# Altium schematic symbol library jlcpcb_2025_04_capacitors_extended_0603.schlib: 3668 symbols (part 17 of 20) (continued)
## GRM1882C1H331GA01D
designator C?  Capacitance: 330pF  (hidden comment: *)
Capacitor, Ceramic (MLCC), 330pF, ±2%, ±2%, SMD 0603; Manufacturer: Murata Electronics; Manufacturer Part Number: GRM1882C1H331GA01D; Package Size: 0603; JLCPCB Basic Part: No; JLCPCB Part Number: C913761; Supplier 1: LCSC; Category: Capacitors - MLCC; Supplier Part Number 1: C913761; Tolerance: ±2%; RoHS: Yes; ComponentLink1Description: Datasheet; ComponentLink1URL: https://wmsc.lcsc.com/wmsc/upload/file/pdf/v2/lcsc/2201131300_Murata-Electronics-GRM1882C1H331GA01D_C913761.pdf; ComponentLink2Description: JLCPCB Part URL; ComponentLink2URL: https://jlcpcb.com/partdetail/C913761; ComponentLink3Description: LCSC Part URL; ComponentLink3URL: https://lcsc.com/product-detail/Multilayer-Ceramic-Capacitors-MLCC---SMD-SMT_Murata-Electronics-Murata-Electronics-GRM1882C1H331GA01D_C913761.html
footprint CAP-0603 (0603 (1608M) Capacitor)
pins: 1, 2

## GRM1882C1H470JA01D
designator C?  Capacitance: 47pF  (hidden comment: *)
Capacitor, Ceramic (MLCC), 47pF, ±5%, ±5%, SMD 0603; Manufacturer: Murata Electronics; Manufacturer Part Number: GRM1882C1H470JA01D; Package Size: 0603; JLCPCB Basic Part: No; JLCPCB Part Number: C783271; Supplier 1: LCSC; Category: Capacitors - MLCC; Supplier Part Number 1: C783271; Tolerance: ±5%; RoHS: Yes; ComponentLink1Description: Datasheet; ComponentLink1URL: https://wmsc.lcsc.com/wmsc/upload/file/pdf/v2/lcsc/2304140030_Murata-Electronics-GRM1882C1H470JA01D_C783271.pdf; ComponentLink2Description: JLCPCB Part URL; ComponentLink2URL: https://jlcpcb.com/partdetail/C783271; ComponentLink3Description: LCSC Part URL; ComponentLink3URL: https://lcsc.com/product-detail/Multilayer-Ceramic-Capacitors-MLCC---SMD-SMT_Murata-Electronics-Murata-Electronics-GRM1882C1H470JA01D_C783271.html
footprint CAP-0603 (0603 (1608M) Capacitor)
pins: 1, 2

## GRM1882C1H680JA01D
designator C?  Capacitance: 68pF  (hidden comment: *)
Capacitor, Ceramic (MLCC), 68pF, ±5%, 50V, CH, ±5%, SMD 0603; Manufacturer: Murata Electronics; Manufacturer Part Number: GRM1882C1H680JA01D; Package Size: 0603; JLCPCB Basic Part: No; JLCPCB Part Number: C464424; Supplier 1: LCSC; Category: Capacitors - MLCC; Supplier Part Number 1: C464424; Tolerance: ±5%; Voltage Rating: 50V; Temperature Coefficient: CH; RoHS: Yes; ComponentLink1Description: Datasheet; ComponentLink1URL: https://wmsc.lcsc.com/wmsc/upload/file/pdf/v2/lcsc/2304140030_Murata-Electronics-GRM1882C1H680JA01D_C464424.pdf; ComponentLink2Description: JLCPCB Part URL; ComponentLink2URL: https://jlcpcb.com/partdetail/C464424; ComponentLink3Description: LCSC Part URL; ComponentLink3URL: https://lcsc.com/product-detail/Multilayer-Ceramic-Capacitors-MLCC---SMD-SMT_Murata-Electronics-Murata-Electronics-GRM1882C1H680JA01D_C464424.html
footprint CAP-0603 (0603 (1608M) Capacitor)
pins: 1, 2

## GRM1882C1H821JA01D
designator C?  Capacitance: 820pF  (hidden comment: *)
Capacitor, Ceramic (MLCC), 820pF, ±5%, 50V, CH, ±5%, SMD 0603; Manufacturer: Murata Electronics; Manufacturer Part Number: GRM1882C1H821JA01D; Package Size: 0603; JLCPCB Basic Part: No; JLCPCB Part Number: C363961; Supplier 1: LCSC; Category: Capacitors - MLCC; Supplier Part Number 1: C363961; Tolerance: ±5%; Voltage Rating: 50V; Temperature Coefficient: CH; RoHS: Yes; ComponentLink1Description: Datasheet; ComponentLink1URL: https://wmsc.lcsc.com/wmsc/upload/file/pdf/v2/lcsc/1912111437_Murata-Electronics-GRM1882C1H821JA01D_C363961.pdf; ComponentLink2Description: JLCPCB Part URL; ComponentLink2URL: https://jlcpcb.com/partdetail/C363961; ComponentLink3Description: LCSC Part URL; ComponentLink3URL: https://lcsc.com/product-detail/Multilayer-Ceramic-Capacitors-MLCC---SMD-SMT_Murata-Electronics-Murata-Electronics-GRM1882C1H821JA01D_C363961.html
footprint CAP-0603 (0603 (1608M) Capacitor)
pins: 1, 2

## GRM1882C2A101JA01D
designator C?  Capacitance: 100pF  (hidden comment: *)
Capacitor, Ceramic (MLCC), 100pF, ±5%, ±5%, SMD 0603; Manufacturer: Murata Electronics; Manufacturer Part Number: GRM1882C2A101JA01D; Package Size: 0603; JLCPCB Basic Part: No; JLCPCB Part Number: C913650; Supplier 1: LCSC; Category: Capacitors - MLCC; Supplier Part Number 1: C913650; Tolerance: ±5%; RoHS: Yes; ComponentLink1Description: Datasheet; ComponentLink1URL: https://wmsc.lcsc.com/wmsc/upload/file/pdf/v2/lcsc/2201131300_Murata-Electronics-GRM1882C2A101JA01D_C913650.pdf; ComponentLink2Description: JLCPCB Part URL; ComponentLink2URL: https://jlcpcb.com/partdetail/C913650; ComponentLink3Description: LCSC Part URL; ComponentLink3URL: https://lcsc.com/product-detail/Multilayer-Ceramic-Capacitors-MLCC---SMD-SMT_Murata-Electronics-Murata-Electronics-GRM1882C2A101JA01D_C913650.html
footprint CAP-0603 (0603 (1608M) Capacitor)
pins: 1, 2

## GRM1882C2A471JA01D
designator C?  Capacitance: 470pF  (hidden comment: *)
Capacitor, Ceramic (MLCC), 470pF, ±5%, ±5%, SMD 0603; Manufacturer: Murata Electronics; Manufacturer Part Number: GRM1882C2A471JA01D; Package Size: 0603; JLCPCB Basic Part: No; JLCPCB Part Number: C913649; Supplier 1: LCSC; Category: Capacitors - MLCC; Supplier Part Number 1: C913649; Tolerance: ±5%; RoHS: Yes; ComponentLink1Description: Datasheet; ComponentLink1URL: https://wmsc.lcsc.com/wmsc/upload/file/pdf/v2/lcsc/2201131300_Murata-Electronics-GRM1882C2A471JA01D_C913649.pdf; ComponentLink2Description: JLCPCB Part URL; ComponentLink2URL: https://jlcpcb.com/partdetail/C913649; ComponentLink3Description: LCSC Part URL; ComponentLink3URL: https://lcsc.com/product-detail/Multilayer-Ceramic-Capacitors-MLCC---SMD-SMT_Murata-Electronics-Murata-Electronics-GRM1882C2A471JA01D_C913649.html
footprint CAP-0603 (0603 (1608M) Capacitor)
pins: 1, 2

## GRM1885C1E103GA01D
designator C?  Capacitance: 10nF  (hidden comment: *)
Capacitor, Ceramic (MLCC), 10nF, ±2%, 25V, C0G, ±2%, SMD 0603; Manufacturer: Murata Electronics; Manufacturer Part Number: GRM1885C1E103GA01D; Package Size: 0603; JLCPCB Basic Part: No; JLCPCB Part Number: C527623; Supplier 1: LCSC; Category: Capacitors - MLCC; Supplier Part Number 1: C527623; Tolerance: ±2%; Voltage Rating: 25V; Temperature Coefficient: C0G; RoHS: Yes; ComponentLink1Description: Datasheet; ComponentLink1URL: https://wmsc.lcsc.com/wmsc/upload/file/pdf/v2/lcsc/2005150732_Murata-Electronics-GRM1885C1E103GA01D_C527623.pdf; ComponentLink2Description: JLCPCB Part URL; ComponentLink2URL: https://jlcpcb.com/partdetail/C527623; ComponentLink3Description: LCSC Part URL; ComponentLink3URL: https://lcsc.com/product-detail/Multilayer-Ceramic-Capacitors-MLCC---SMD-SMT_Murata-Electronics-Murata-Electronics-GRM1885C1E103GA01D_C527623.html
footprint CAP-0603 (0603 (1608M) Capacitor)
pins: 1, 2

## GRM1885C1H1R0CA01D
designator C?  Capacitance: 1pF  (hidden comment: *)
Capacitor, Ceramic (MLCC), 1pF, 50V, C0G, SMD 0603; Manufacturer: Murata Electronics; Manufacturer Part Number: GRM1885C1H1R0CA01D; Package Size: 0603; JLCPCB Basic Part: No; JLCPCB Part Number: C162206; Supplier 1: LCSC; Category: Capacitors - MLCC; Supplier Part Number 1: C162206; Voltage Rating: 50V; Temperature Coefficient: C0G; RoHS: Yes; ComponentLink1Description: Datasheet; ComponentLink1URL: https://wmsc.lcsc.com/wmsc/upload/file/pdf/v2/lcsc/2304140030_Murata-Electronics-GRM1885C1H1R0CA01D_C162206.pdf; ComponentLink2Description: JLCPCB Part URL; ComponentLink2URL: https://jlcpcb.com/partdetail/C162206; ComponentLink3Description: LCSC Part URL; ComponentLink3URL: https://lcsc.com/product-detail/Multilayer-Ceramic-Capacitors-MLCC---SMD-SMT_Murata-Electronics-Murata-Electronics-GRM1885C1H1R0CA01D_C162206.html
footprint CAP-0603 (0603 (1608M) Capacitor)
pins: 1, 2

## GRM1885C1H1R0WA01D
designator C?  Capacitance: 1pF  (hidden comment: *)
Capacitor, Ceramic (MLCC), 1pF, null, null, SMD 0603; Manufacturer: Murata Electronics; Manufacturer Part Number: GRM1885C1H1R0WA01D; Package Size: 0603; JLCPCB Basic Part: No; JLCPCB Part Number: C524619; Supplier 1: LCSC; Category: Capacitors - MLCC; Supplier Part Number 1: C524619; Voltage Rating: null; Temperature Coefficient: null; RoHS: Yes; ComponentLink1Description: Datasheet; ComponentLink1URL: https://wmsc.lcsc.com/wmsc/upload/file/pdf/v2/lcsc/2009021102_Murata-Electronics-GRM1885C1H1R0WA01D_C524619.pdf; ComponentLink2Description: JLCPCB Part URL; ComponentLink2URL: https://jlcpcb.com/partdetail/C524619; ComponentLink3Description: LCSC Part URL; ComponentLink3URL: https://lcsc.com/product-detail/Multilayer-Ceramic-Capacitors-MLCC---SMD-SMT_Murata-Electronics-Murata-Electronics-GRM1885C1H1R0WA01D_C524619.html
footprint CAP-0603 (0603 (1608M) Capacitor)
pins: 1, 2

## GRM1885C1H1R2BA01D
designator C?  Capacitance: 1.2pF  (hidden comment: *)
Capacitor, Ceramic (MLCC), 1.2pF, 50V, C0G, SMD 0603; Manufacturer: Murata Electronics; Manufacturer Part Number: GRM1885C1H1R2BA01D; Package Size: 0603; JLCPCB Basic Part: No; JLCPCB Part Number: C162208; Supplier 1: LCSC; Category: Capacitors - MLCC; Supplier Part Number 1: C162208; Voltage Rating: 50V; Temperature Coefficient: C0G; RoHS: Yes; ComponentLink1Description: Datasheet; ComponentLink1URL: https://wmsc.lcsc.com/wmsc/upload/file/pdf/v2/lcsc/2304140030_Murata-Electronics-GRM1885C1H1R2BA01D_C162208.pdf; ComponentLink2Description: JLCPCB Part URL; ComponentLink2URL: https://jlcpcb.com/partdetail/C162208; ComponentLink3Description: LCSC Part URL; ComponentLink3URL: https://lcsc.com/product-detail/Multilayer-Ceramic-Capacitors-MLCC---SMD-SMT_Murata-Electronics-Murata-Electronics-GRM1885C1H1R2BA01D_C162208.html
footprint CAP-0603 (0603 (1608M) Capacitor)
pins: 1, 2

## GRM1885C1H1R2CA01D
designator C?  Capacitance: 1.2pF  (hidden comment: *)
Capacitor, Ceramic (MLCC), 1.2pF, 50V, C0G, SMD 0603; Manufacturer: Murata Electronics; Manufacturer Part Number: GRM1885C1H1R2CA01D; Package Size: 0603; JLCPCB Basic Part: No; JLCPCB Part Number: C437533; Supplier 1: LCSC; Category: Capacitors - MLCC; Supplier Part Number 1: C437533; Voltage Rating: 50V; Temperature Coefficient: C0G; RoHS: Yes; ComponentLink1Description: Datasheet; ComponentLink1URL: https://wmsc.lcsc.com/wmsc/upload/file/pdf/v2/lcsc/2304140030_Murata-Electronics-GRM1885C1H1R2CA01D_C437533.pdf; ComponentLink2Description: JLCPCB Part URL; ComponentLink2URL: https://jlcpcb.com/partdetail/C437533; ComponentLink3Description: LCSC Part URL; ComponentLink3URL: https://lcsc.com/product-detail/Multilayer-Ceramic-Capacitors-MLCC---SMD-SMT_Murata-Electronics-Murata-Electronics-GRM1885C1H1R2CA01D_C437533.html
footprint CAP-0603 (0603 (1608M) Capacitor)
pins: 1, 2

## GRM1885C1H1R2WA01D
designator C?  Capacitance: 1.2pF  (hidden comment: *)
Capacitor, Ceramic (MLCC), 1.2pF, SMD 0603; Manufacturer: Murata Electronics; Manufacturer Part Number: GRM1885C1H1R2WA01D; Package Size: 0603; JLCPCB Basic Part: No; JLCPCB Part Number: C913539; Supplier 1: LCSC; Category: Capacitors - MLCC; Supplier Part Number 1: C913539; RoHS: Yes; ComponentLink1Description: Datasheet; ComponentLink1URL: https://wmsc.lcsc.com/wmsc/upload/file/pdf/v2/lcsc/2201131300_Murata-Electronics-GRM1885C1H1R2WA01D_C913539.pdf; ComponentLink2Description: JLCPCB Part URL; ComponentLink2URL: https://jlcpcb.com/partdetail/C913539; ComponentLink3Description: LCSC Part URL; ComponentLink3URL: https://lcsc.com/product-detail/Multilayer-Ceramic-Capacitors-MLCC---SMD-SMT_Murata-Electronics-Murata-Electronics-GRM1885C1H1R2WA01D_C913539.html
footprint CAP-0603 (0603 (1608M) Capacitor)
pins: 1, 2

## GRM1885C1H1R3WA01D
designator C?  Capacitance: 1.3pF  (hidden comment: *)
Capacitor, Ceramic (MLCC), 1.3pF, SMD 0603; Manufacturer: Murata Electronics; Manufacturer Part Number: GRM1885C1H1R3WA01D; Package Size: 0603; JLCPCB Basic Part: No; JLCPCB Part Number: C907985; Supplier 1: LCSC; Category: Capacitors - MLCC; Supplier Part Number 1: C907985; RoHS: Yes; ComponentLink1Description: Datasheet; ComponentLink1URL: https://wmsc.lcsc.com/wmsc/upload/file/pdf/v2/lcsc/2011291635_Murata-Electronics-GRM1885C1H1R3WA01D_C907985.pdf; ComponentLink2Description: JLCPCB Part URL; ComponentLink2URL: https://jlcpcb.com/partdetail/C907985; ComponentLink3Description: LCSC Part URL; ComponentLink3URL: https://lcsc.com/product-detail/Multilayer-Ceramic-Capacitors-MLCC---SMD-SMT_Murata-Electronics-Murata-Electronics-GRM1885C1H1R3WA01D_C907985.html
footprint CAP-0603 (0603 (1608M) Capacitor)
pins: 1, 2

## GRM1885C1H2R0BA01D
designator C?  Capacitance: 2pF  (hidden comment: *)
Capacitor, Ceramic (MLCC), 2pF, 50V, C0G, SMD 0603; Manufacturer: Murata Electronics; Manufacturer Part Number: GRM1885C1H2R0BA01D; Package Size: 0603; JLCPCB Basic Part: No; JLCPCB Part Number: C81437; Supplier 1: LCSC; Category: Capacitors - MLCC; Supplier Part Number 1: C81437; Voltage Rating: 50V; Temperature Coefficient: C0G; RoHS: Yes; ComponentLink1Description: Datasheet; ComponentLink1URL: https://wmsc.lcsc.com/wmsc/upload/file/pdf/v2/lcsc/2001171841_Murata-Electronics-GRM1885C1H2R0BA01D_C81437.pdf; ComponentLink2Description: JLCPCB Part URL; ComponentLink2URL: https://jlcpcb.com/partdetail/C81437; ComponentLink3Description: LCSC Part URL; ComponentLink3URL: https://lcsc.com/product-detail/Multilayer-Ceramic-Capacitors-MLCC---SMD-SMT_Murata-Electronics-Murata-Electronics-GRM1885C1H2R0BA01D_C81437.html
footprint CAP-0603 (0603 (1608M) Capacitor)
pins: 1, 2

## GRM1885C1H2R4CA01D
designator C?  Capacitance: 2.4pF  (hidden comment: *)
Capacitor, Ceramic (MLCC), 2.4pF, 50V, C0G, SMD 0603; Manufacturer: Murata Electronics; Manufacturer Part Number: GRM1885C1H2R4CA01D; Package Size: 0603; JLCPCB Basic Part: No; JLCPCB Part Number: C710896; Supplier 1: LCSC; Category: Capacitors - MLCC; Supplier Part Number 1: C710896; Voltage Rating: 50V; Temperature Coefficient: C0G; RoHS: Yes; ComponentLink1Description: Datasheet; ComponentLink1URL: https://wmsc.lcsc.com/wmsc/upload/file/pdf/v2/lcsc/2201242200_Murata-Electronics-GRM1885C1H2R4CA01D_C710896.pdf; ComponentLink2Description: JLCPCB Part URL; ComponentLink2URL: https://jlcpcb.com/partdetail/C710896; ComponentLink3Description: LCSC Part URL; ComponentLink3URL: https://lcsc.com/product-detail/Multilayer-Ceramic-Capacitors-MLCC---SMD-SMT_Murata-Electronics-Murata-Electronics-GRM1885C1H2R4CA01D_C710896.html
footprint CAP-0603 (0603 (1608M) Capacitor)
pins: 1, 2

## GRM1885C1H2R7BA01D
designator C?  Capacitance: 2.7pF  (hidden comment: *)
Capacitor, Ceramic (MLCC), 2.7pF, 50V, C0G, SMD 0603; Manufacturer: Murata Electronics; Manufacturer Part Number: GRM1885C1H2R7BA01D; Package Size: 0603; JLCPCB Basic Part: No; JLCPCB Part Number: C162221; Supplier 1: LCSC; Category: Capacitors - MLCC; Supplier Part Number 1: C162221; Voltage Rating: 50V; Temperature Coefficient: C0G; RoHS: Yes; ComponentLink1Description: Datasheet; ComponentLink1URL: https://wmsc.lcsc.com/wmsc/upload/file/pdf/v2/lcsc/2304140030_Murata-Electronics-GRM1885C1H2R7BA01D_C162221.pdf; ComponentLink2Description: JLCPCB Part URL; ComponentLink2URL: https://jlcpcb.com/partdetail/C162221; ComponentLink3Description: LCSC Part URL; ComponentLink3URL: https://lcsc.com/product-detail/Multilayer-Ceramic-Capacitors-MLCC---SMD-SMT_Murata-Electronics-Murata-Electronics-GRM1885C1H2R7BA01D_C162221.html
footprint CAP-0603 (0603 (1608M) Capacitor)
pins: 1, 2

## GRM1885C1H2R7CA01D
designator C?  Capacitance: 2.7pF  (hidden comment: *)
Capacitor, Ceramic (MLCC), 2.7pF, null, null, SMD 0603; Manufacturer: Murata Electronics; Manufacturer Part Number: GRM1885C1H2R7CA01D; Package Size: 0603; JLCPCB Basic Part: No; JLCPCB Part Number: C701311; Supplier 1: LCSC; Category: Capacitors - MLCC; Supplier Part Number 1: C701311; Voltage Rating: null; Temperature Coefficient: null; RoHS: Yes; ComponentLink1Description: Datasheet; ComponentLink1URL: https://wmsc.lcsc.com/wmsc/upload/file/pdf/v2/lcsc/2304140030_Murata-Electronics-GRM1885C1H2R7CA01D_C701311.pdf; ComponentLink2Description: JLCPCB Part URL; ComponentLink2URL: https://jlcpcb.com/partdetail/C701311; ComponentLink3Description: LCSC Part URL; ComponentLink3URL: https://lcsc.com/product-detail/Multilayer-Ceramic-Capacitors-MLCC---SMD-SMT_Murata-Electronics-Murata-Electronics-GRM1885C1H2R7CA01D_C701311.html
footprint CAP-0603 (0603 (1608M) Capacitor)
pins: 1, 2

## GRM1885C1H3R0CA01D
designator C?  Capacitance: 3pF  (hidden comment: *)
Capacitor, Ceramic (MLCC), 3pF, 50V, C0G, SMD 0603; Manufacturer: Murata Electronics; Manufacturer Part Number: GRM1885C1H3R0CA01D; Package Size: 0603; JLCPCB Basic Part: No; JLCPCB Part Number: C162223; Supplier 1: LCSC; Category: Capacitors - MLCC; Supplier Part Number 1: C162223; Voltage Rating: 50V; Temperature Coefficient: C0G; RoHS: Yes; ComponentLink1Description: Datasheet; ComponentLink1URL: https://wmsc.lcsc.com/wmsc/upload/file/pdf/v2/lcsc/2304140030_Murata-Electronics-GRM1885C1H3R0CA01D_C162223.pdf; ComponentLink2Description: JLCPCB Part URL; ComponentLink2URL: https://jlcpcb.com/partdetail/C162223; ComponentLink3Description: LCSC Part URL; ComponentLink3URL: https://lcsc.com/product-detail/Multilayer-Ceramic-Capacitors-MLCC---SMD-SMT_Murata-Electronics-Murata-Electronics-GRM1885C1H3R0CA01D_C162223.html
footprint CAP-0603 (0603 (1608M) Capacitor)
pins: 1, 2

## GRM1885C1H3R3BA01D
designator C?  Capacitance: 3.3pF  (hidden comment: *)
Capacitor, Ceramic (MLCC), 3.3pF, 50V, C0G, SMD 0603; Manufacturer: Murata Electronics; Manufacturer Part Number: GRM1885C1H3R3BA01D; Package Size: 0603; JLCPCB Basic Part: No; JLCPCB Part Number: C162224; Supplier 1: LCSC; Category: Capacitors - MLCC; Supplier Part Number 1: C162224; Voltage Rating: 50V; Temperature Coefficient: C0G; RoHS: Yes; ComponentLink1Description: Datasheet; ComponentLink1URL: https://wmsc.lcsc.com/wmsc/upload/file/pdf/v2/lcsc/2401250905_Murata-Electronics-GRM1885C1H3R3BA01D_C162224.pdf; ComponentLink2Description: JLCPCB Part URL; ComponentLink2URL: https://jlcpcb.com/partdetail/C162224; ComponentLink3Description: LCSC Part URL; ComponentLink3URL: https://lcsc.com/product-detail/Multilayer-Ceramic-Capacitors-MLCC---SMD-SMT_Murata-Electronics-Murata-Electronics-GRM1885C1H3R3BA01D_C162224.html
footprint CAP-0603 (0603 (1608M) Capacitor)
pins: 1, 2

## GRM1885C1H3R3CA01D
designator C?  Capacitance: 3.3pF  (hidden comment: *)
Capacitor, Ceramic (MLCC), 3.3pF, 50V, C0G, SMD 0603; Manufacturer: Murata Electronics; Manufacturer Part Number: GRM1885C1H3R3CA01D; Package Size: 0603; JLCPCB Basic Part: No; JLCPCB Part Number: C162225; Supplier 1: LCSC; Category: Capacitors - MLCC; Supplier Part Number 1: C162225; Voltage Rating: 50V; Temperature Coefficient: C0G; RoHS: Yes; ComponentLink1Description: Datasheet; ComponentLink1URL: https://wmsc.lcsc.com/wmsc/upload/file/pdf/v2/lcsc/1810311132_Murata-Electronics-GRM1885C1H3R3CA01D_C162225.pdf; ComponentLink2Description: JLCPCB Part URL; ComponentLink2URL: https://jlcpcb.com/partdetail/C162225; ComponentLink3Description: LCSC Part URL; ComponentLink3URL: https://lcsc.com/product-detail/Multilayer-Ceramic-Capacitors-MLCC---SMD-SMT_Murata-Electronics-Murata-Electronics-GRM1885C1H3R3CA01D_C162225.html
footprint CAP-0603 (0603 (1608M) Capacitor)
pins: 1, 2

## GRM1885C1H3R5BA01D
designator C?  Capacitance: 3.5pF  (hidden comment: *)
Capacitor, Ceramic (MLCC), 3.5pF, 50V, C0G, SMD 0603; Manufacturer: Murata Electronics; Manufacturer Part Number: GRM1885C1H3R5BA01D; Package Size: 0603; JLCPCB Basic Part: No; JLCPCB Part Number: C464415; Supplier 1: LCSC; Category: Capacitors - MLCC; Supplier Part Number 1: C464415; Voltage Rating: 50V; Temperature Coefficient: C0G; RoHS: Yes; ComponentLink1Description: Datasheet; ComponentLink1URL: https://wmsc.lcsc.com/wmsc/upload/file/pdf/v2/lcsc/2304140030_Murata-Electronics-GRM1885C1H3R5BA01D_C464415.pdf; ComponentLink2Description: JLCPCB Part URL; ComponentLink2URL: https://jlcpcb.com/partdetail/C464415; ComponentLink3Description: LCSC Part URL; ComponentLink3URL: https://lcsc.com/product-detail/Multilayer-Ceramic-Capacitors-MLCC---SMD-SMT_Murata-Electronics-Murata-Electronics-GRM1885C1H3R5BA01D_C464415.html
footprint CAP-0603 (0603 (1608M) Capacitor)
pins: 1, 2

## GRM1885C1H3R9BA01D
designator C?  Capacitance: 3.9pF  (hidden comment: *)
Capacitor, Ceramic (MLCC), 3.9pF, 50V, null, SMD 0603; Manufacturer: Murata Electronics; Manufacturer Part Number: GRM1885C1H3R9BA01D; Package Size: 0603; JLCPCB Basic Part: No; JLCPCB Part Number: C162229; Supplier 1: LCSC; Category: Capacitors - MLCC; Supplier Part Number 1: C162229; Voltage Rating: 50V; Temperature Coefficient: null; RoHS: Yes; ComponentLink1Description: Datasheet; ComponentLink1URL: https://wmsc.lcsc.com/wmsc/upload/file/pdf/v2/lcsc/2010101433_Murata-Electronics-GRM1885C1H3R9BA01D_C162229.pdf; ComponentLink2Description: JLCPCB Part URL; ComponentLink2URL: https://jlcpcb.com/partdetail/C162229; ComponentLink3Description: LCSC Part URL; ComponentLink3URL: https://lcsc.com/product-detail/Multilayer-Ceramic-Capacitors-MLCC---SMD-SMT_Murata-Electronics-Murata-Electronics-GRM1885C1H3R9BA01D_C162229.html
footprint CAP-0603 (0603 (1608M) Capacitor)
pins: 1, 2

## GRM1885C1H3R9CA01D
designator C?  Capacitance: 3.9pF  (hidden comment: *)
Capacitor, Ceramic (MLCC), 3.9pF, 50V, C0G, SMD 0603; Manufacturer: Murata Electronics; Manufacturer Part Number: GRM1885C1H3R9CA01D; Package Size: 0603; JLCPCB Basic Part: No; JLCPCB Part Number: C162230; Supplier 1: LCSC; Category: Capacitors - MLCC; Supplier Part Number 1: C162230; Voltage Rating: 50V; Temperature Coefficient: C0G; RoHS: Yes; ComponentLink1Description: Datasheet; ComponentLink1URL: https://wmsc.lcsc.com/wmsc/upload/file/pdf/v2/lcsc/2308111539_Murata-Electronics-GRM1885C1H3R9CA01D_C162230.pdf; ComponentLink2Description: JLCPCB Part URL; ComponentLink2URL: https://jlcpcb.com/partdetail/C162230; ComponentLink3Description: LCSC Part URL; ComponentLink3URL: https://lcsc.com/product-detail/Multilayer-Ceramic-Capacitors-MLCC---SMD-SMT_Murata-Electronics-Murata-Electronics-GRM1885C1H3R9CA01D_C162230.html
footprint CAP-0603 (0603 (1608M) Capacitor)
pins: 1, 2

## GRM1885C1H4R0BA01D
designator C?  Capacitance: 4pF  (hidden comment: *)
Capacitor, Ceramic (MLCC), 4pF, 50V, null, SMD 0603; Manufacturer: Murata Electronics; Manufacturer Part Number: GRM1885C1H4R0BA01D; Package Size: 0603; JLCPCB Basic Part: No; JLCPCB Part Number: C162232; Supplier 1: LCSC; Category: Capacitors - MLCC; Supplier Part Number 1: C162232; Voltage Rating: 50V; Temperature Coefficient: null; RoHS: Yes; ComponentLink1Description: Datasheet; ComponentLink1URL: https://wmsc.lcsc.com/wmsc/upload/file/pdf/v2/lcsc/2012211404_Murata-Electronics-GRM1885C1H4R0BA01D_C162232.pdf; ComponentLink2Description: JLCPCB Part URL; ComponentLink2URL: https://jlcpcb.com/partdetail/C162232; ComponentLink3Description: LCSC Part URL; ComponentLink3URL: https://lcsc.com/product-detail/Multilayer-Ceramic-Capacitors-MLCC---SMD-SMT_Murata-Electronics-Murata-Electronics-GRM1885C1H4R0BA01D_C162232.html
footprint CAP-0603 (0603 (1608M) Capacitor)
pins: 1, 2

## GRM1885C1H4R0CA01D
designator C?  Capacitance: 4pF  (hidden comment: *)
Capacitor, Ceramic (MLCC), 4pF, 50V, C0G, SMD 0603; Manufacturer: Murata Electronics; Manufacturer Part Number: GRM1885C1H4R0CA01D; Package Size: 0603; JLCPCB Basic Part: No; JLCPCB Part Number: C437534; Supplier 1: LCSC; Category: Capacitors - MLCC; Supplier Part Number 1: C437534; Voltage Rating: 50V; Temperature Coefficient: C0G; RoHS: Yes; ComponentLink1Description: Datasheet; ComponentLink1URL: https://wmsc.lcsc.com/wmsc/upload/file/pdf/v2/lcsc/2304140030_Murata-Electronics-GRM1885C1H4R0CA01D_C437534.pdf; ComponentLink2Description: JLCPCB Part URL; ComponentLink2URL: https://jlcpcb.com/partdetail/C437534; ComponentLink3Description: LCSC Part URL; ComponentLink3URL: https://lcsc.com/product-detail/Multilayer-Ceramic-Capacitors-MLCC---SMD-SMT_Murata-Electronics-Murata-Electronics-GRM1885C1H4R0CA01D_C437534.html
footprint CAP-0603 (0603 (1608M) Capacitor)
pins: 1, 2

## GRM1885C1H5R6BA01D
designator C?  Capacitance: 5.6pF  (hidden comment: *)
Capacitor, Ceramic (MLCC), 5.6pF, 50V, null, SMD 0603; Manufacturer: Murata Electronics; Manufacturer Part Number: GRM1885C1H5R6BA01D; Package Size: 0603; JLCPCB Basic Part: No; JLCPCB Part Number: C162238; Supplier 1: LCSC; Category: Capacitors - MLCC; Supplier Part Number 1: C162238; Voltage Rating: 50V; Temperature Coefficient: null; RoHS: Yes; ComponentLink1Description: Datasheet; ComponentLink1URL: https://wmsc.lcsc.com/wmsc/upload/file/pdf/v2/lcsc/2010101433_Murata-Electronics-GRM1885C1H5R6BA01D_C162238.pdf; ComponentLink2Description: JLCPCB Part URL; ComponentLink2URL: https://jlcpcb.com/partdetail/C162238; ComponentLink3Description: LCSC Part URL; ComponentLink3URL: https://lcsc.com/product-detail/Multilayer-Ceramic-Capacitors-MLCC---SMD-SMT_Murata-Electronics-Murata-Electronics-GRM1885C1H5R6BA01D_C162238.html
footprint CAP-0603 (0603 (1608M) Capacitor)
pins: 1, 2

## GRM1885C1H6R0DA01D
designator C?  Capacitance: 6pF  (hidden comment: *)
Capacitor, Ceramic (MLCC), 6pF, null, null, SMD 0603; Manufacturer: Murata Electronics; Manufacturer Part Number: GRM1885C1H6R0DA01D; Package Size: 0603; JLCPCB Basic Part: No; JLCPCB Part Number: C426066; Supplier 1: LCSC; Category: Capacitors - MLCC; Supplier Part Number 1: C426066; Voltage Rating: null; Temperature Coefficient: null; RoHS: Yes; ComponentLink1Description: Datasheet; ComponentLink1URL: https://wmsc.lcsc.com/wmsc/upload/file/pdf/v2/lcsc/2304140030_Murata-Electronics-GRM1885C1H6R0DA01D_C426066.pdf; ComponentLink2Description: JLCPCB Part URL; ComponentLink2URL: https://jlcpcb.com/partdetail/C426066; ComponentLink3Description: LCSC Part URL; ComponentLink3URL: https://lcsc.com/product-detail/Multilayer-Ceramic-Capacitors-MLCC---SMD-SMT_Murata-Electronics-Murata-Electronics-GRM1885C1H6R0DA01D_C426066.html
footprint CAP-0603 (0603 (1608M) Capacitor)
pins: 1, 2

## GRM1885C1H6R2DA01D
designator C?  Capacitance: 6.2pF  (hidden comment: *)
Capacitor, Ceramic (MLCC), 6.2pF, 50V, C0G, SMD 0603; Manufacturer: Murata Electronics; Manufacturer Part Number: GRM1885C1H6R2DA01D; Package Size: 0603; JLCPCB Basic Part: No; JLCPCB Part Number: C464410; Supplier 1: LCSC; Category: Capacitors - MLCC; Supplier Part Number 1: C464410; Voltage Rating: 50V; Temperature Coefficient: C0G; RoHS: Yes; ComponentLink1Description: Datasheet; ComponentLink1URL: https://wmsc.lcsc.com/wmsc/upload/file/pdf/v2/lcsc/2304140030_Murata-Electronics-GRM1885C1H6R2DA01D_C464410.pdf; ComponentLink2Description: JLCPCB Part URL; ComponentLink2URL: https://jlcpcb.com/partdetail/C464410; ComponentLink3Description: LCSC Part URL; ComponentLink3URL: https://lcsc.com/product-detail/Multilayer-Ceramic-Capacitors-MLCC---SMD-SMT_Murata-Electronics-Murata-Electronics-GRM1885C1H6R2DA01D_C464410.html
footprint CAP-0603 (0603 (1608M) Capacitor)
pins: 1, 2

## GRM1885C1H6R8CA01D
designator C?  Capacitance: 6.8pF  (hidden comment: *)
Capacitor, Ceramic (MLCC), 6.8pF, null, C0G, SMD 0603; Manufacturer: Murata Electronics; Manufacturer Part Number: GRM1885C1H6R8CA01D; Package Size: 0603; JLCPCB Basic Part: No; JLCPCB Part Number: C162245; Supplier 1: LCSC; Category: Capacitors - MLCC; Supplier Part Number 1: C162245; Voltage Rating: null; Temperature Coefficient: C0G; RoHS: Yes; ComponentLink1Description: Datasheet; ComponentLink1URL: https://wmsc.lcsc.com/wmsc/upload/file/pdf/v2/lcsc/1810311132_Murata-Electronics-GRM1885C1H6R8CA01D_C162245.pdf; ComponentLink2Description: JLCPCB Part URL; ComponentLink2URL: https://jlcpcb.com/partdetail/C162245; ComponentLink3Description: LCSC Part URL; ComponentLink3URL: https://lcsc.com/product-detail/Multilayer-Ceramic-Capacitors-MLCC---SMD-SMT_Murata-Electronics-Murata-Electronics-GRM1885C1H6R8CA01D_C162245.html
footprint CAP-0603 (0603 (1608M) Capacitor)
pins: 1, 2

## GRM1885C1H7R0CA01D
designator C?  Capacitance: 7pF  (hidden comment: *)
Capacitor, Ceramic (MLCC), 7pF, SMD 0603; Manufacturer: Murata Electronics; Manufacturer Part Number: GRM1885C1H7R0CA01D; Package Size: 0603; JLCPCB Basic Part: No; JLCPCB Part Number: C440184; Supplier 1: LCSC; Category: Capacitors - MLCC; Supplier Part Number 1: C440184; RoHS: Yes; ComponentLink1Description: Datasheet; ComponentLink1URL: https://wmsc.lcsc.com/wmsc/upload/file/pdf/v2/lcsc/2304140030_Murata-Electronics-GRM1885C1H7R0CA01D_C440184.pdf; ComponentLink2Description: JLCPCB Part URL; ComponentLink2URL: https://jlcpcb.com/partdetail/C440184; ComponentLink3Description: LCSC Part URL; ComponentLink3URL: https://lcsc.com/product-detail/Multilayer-Ceramic-Capacitors-MLCC---SMD-SMT_Murata-Electronics-Murata-Electronics-GRM1885C1H7R0CA01D_C440184.html
footprint CAP-0603 (0603 (1608M) Capacitor)
pins: 1, 2

## GRM1885C1H7R5CA01D
designator C?  Capacitance: 7.5pF  (hidden comment: *)
Capacitor, Ceramic (MLCC), 7.5pF, 50V, C0G, SMD 0603; Manufacturer: Murata Electronics; Manufacturer Part Number: GRM1885C1H7R5CA01D; Package Size: 0603; JLCPCB Basic Part: No; JLCPCB Part Number: C415407; Supplier 1: LCSC; Category: Capacitors - MLCC; Supplier Part Number 1: C415407; Voltage Rating: 50V; Temperature Coefficient: C0G; RoHS: Yes; ComponentLink1Description: Datasheet; ComponentLink1URL: https://wmsc.lcsc.com/wmsc/upload/file/pdf/v2/lcsc/2304140030_Murata-Electronics-GRM1885C1H7R5CA01D_C415407.pdf; ComponentLink2Description: JLCPCB Part URL; ComponentLink2URL: https://jlcpcb.com/partdetail/C415407; ComponentLink3Description: LCSC Part URL; ComponentLink3URL: https://lcsc.com/product-detail/Multilayer-Ceramic-Capacitors-MLCC---SMD-SMT_Murata-Electronics-Murata-Electronics-GRM1885C1H7R5CA01D_C415407.html
footprint CAP-0603 (0603 (1608M) Capacitor)
pins: 1, 2

## GRM1885C1H8R0CA01D
designator C?  Capacitance: 8pF  (hidden comment: *)
Capacitor, Ceramic (MLCC), 8pF, 50V, C0G, SMD 0603; Manufacturer: Murata Electronics; Manufacturer Part Number: GRM1885C1H8R0CA01D; Package Size: 0603; JLCPCB Basic Part: No; JLCPCB Part Number: C669502; Supplier 1: LCSC; Category: Capacitors - MLCC; Supplier Part Number 1: C669502; Voltage Rating: 50V; Temperature Coefficient: C0G; RoHS: Yes; ComponentLink1Description: Datasheet; ComponentLink1URL: https://wmsc.lcsc.com/wmsc/upload/file/pdf/v2/lcsc/2006242037_Murata-Electronics-GRM1885C1H8R0CA01D_C669502.pdf; ComponentLink2Description: JLCPCB Part URL; ComponentLink2URL: https://jlcpcb.com/partdetail/C669502; ComponentLink3Description: LCSC Part URL; ComponentLink3URL: https://lcsc.com/product-detail/Multilayer-Ceramic-Capacitors-MLCC---SMD-SMT_Murata-Electronics-Murata-Electronics-GRM1885C1H8R0CA01D_C669502.html
footprint CAP-0603 (0603 (1608M) Capacitor)
pins: 1, 2

## GRM1885C1H8R0DA01D
designator C?  Capacitance: 8pF  (hidden comment: *)
Capacitor, Ceramic (MLCC), 8pF, 50V, C0G, SMD 0603; Manufacturer: Murata Electronics; Manufacturer Part Number: GRM1885C1H8R0DA01D; Package Size: 0603; JLCPCB Basic Part: No; JLCPCB Part Number: C469531; Supplier 1: LCSC; Category: Capacitors - MLCC; Supplier Part Number 1: C469531; Voltage Rating: 50V; Temperature Coefficient: C0G; RoHS: Yes; ComponentLink1Description: Datasheet; ComponentLink1URL: https://wmsc.lcsc.com/wmsc/upload/file/pdf/v2/lcsc/2007151232_Murata-Electronics-GRM1885C1H8R0DA01D_C469531.pdf; ComponentLink2Description: JLCPCB Part URL; ComponentLink2URL: https://jlcpcb.com/partdetail/C469531; ComponentLink3Description: LCSC Part URL; ComponentLink3URL: https://lcsc.com/product-detail/Multilayer-Ceramic-Capacitors-MLCC---SMD-SMT_Murata-Electronics-Murata-Electronics-GRM1885C1H8R0DA01D_C469531.html
footprint CAP-0603 (0603 (1608M) Capacitor)
pins: 1, 2

## GRM1885C1H8R2BA01D
designator C?  Capacitance: 8.2pF  (hidden comment: *)
Capacitor, Ceramic (MLCC), 8.2pF, 50V, SMD 0603; Manufacturer: Murata Electronics; Manufacturer Part Number: GRM1885C1H8R2BA01D; Package Size: 0603; JLCPCB Basic Part: No; JLCPCB Part Number: C162252; Supplier 1: LCSC; Category: Capacitors - MLCC; Supplier Part Number 1: C162252; Voltage Rating: 50V; RoHS: Yes; ComponentLink1Description: Datasheet; ComponentLink1URL: https://wmsc.lcsc.com/wmsc/upload/file/pdf/v2/lcsc/2010221636_Murata-Electronics-GRM1885C1H8R2BA01D_C162252.pdf; ComponentLink2Description: JLCPCB Part URL; ComponentLink2URL: https://jlcpcb.com/partdetail/C162252; ComponentLink3Description: LCSC Part URL; ComponentLink3URL: https://lcsc.com/product-detail/Multilayer-Ceramic-Capacitors-MLCC---SMD-SMT_Murata-Electronics-Murata-Electronics-GRM1885C1H8R2BA01D_C162252.html
footprint CAP-0603 (0603 (1608M) Capacitor)
pins: 1, 2

## GRM1885C1H8R2CA01D
designator C?  Capacitance: 8.2pF  (hidden comment: *)
Capacitor, Ceramic (MLCC), 8.2pF, 50V, C0G, SMD 0603; Manufacturer: Murata Electronics; Manufacturer Part Number: GRM1885C1H8R2CA01D; Package Size: 0603; JLCPCB Basic Part: No; JLCPCB Part Number: C71660; Supplier 1: LCSC; Category: Capacitors - MLCC; Supplier Part Number 1: C71660; Voltage Rating: 50V; Temperature Coefficient: C0G; RoHS: Yes; ComponentLink1Description: Datasheet; ComponentLink1URL: https://wmsc.lcsc.com/wmsc/upload/file/pdf/v2/lcsc/2304140030_Murata-Electronics-GRM1885C1H8R2CA01D_C71660.pdf; ComponentLink2Description: JLCPCB Part URL; ComponentLink2URL: https://jlcpcb.com/partdetail/C71660; ComponentLink3Description: LCSC Part URL; ComponentLink3URL: https://lcsc.com/product-detail/Multilayer-Ceramic-Capacitors-MLCC---SMD-SMT_Murata-Electronics-Murata-Electronics-GRM1885C1H8R2CA01D_C71660.html
footprint CAP-0603 (0603 (1608M) Capacitor)
pins: 1, 2

## GRM1885C1H9R0DA01D
designator C?  Capacitance: 9pF  (hidden comment: *)
Capacitor, Ceramic (MLCC), 9pF, 50V, C0G, SMD 0603; Manufacturer: Murata Electronics; Manufacturer Part Number: GRM1885C1H9R0DA01D; Package Size: 0603; JLCPCB Basic Part: No; JLCPCB Part Number: C430713; Supplier 1: LCSC; Category: Capacitors - MLCC; Supplier Part Number 1: C430713; Voltage Rating: 50V; Temperature Coefficient: C0G; RoHS: Yes; ComponentLink1Description: Datasheet; ComponentLink1URL: https://wmsc.lcsc.com/wmsc/upload/file/pdf/v2/lcsc/2304140030_Murata-Electronics-GRM1885C1H9R0DA01D_C430713.pdf; ComponentLink2Description: JLCPCB Part URL; ComponentLink2URL: https://jlcpcb.com/partdetail/C430713; ComponentLink3Description: LCSC Part URL; ComponentLink3URL: https://lcsc.com/product-detail/Multilayer-Ceramic-Capacitors-MLCC---SMD-SMT_Murata-Electronics-Murata-Electronics-GRM1885C1H9R0DA01D_C430713.html
footprint CAP-0603 (0603 (1608M) Capacitor)
pins: 1, 2

## GRM1885C1H100FA01D
designator C?  Capacitance: 10pF  (hidden comment: *)
Capacitor, Ceramic (MLCC), 10pF, ±1%, 50V, ±1%, SMD 0603; Manufacturer: Murata Electronics; Manufacturer Part Number: GRM1885C1H100FA01D; Package Size: 0603; JLCPCB Basic Part: No; JLCPCB Part Number: C162202; Supplier 1: LCSC; Category: Capacitors - MLCC; Supplier Part Number 1: C162202; Tolerance: ±1%; Voltage Rating: 50V; RoHS: Yes; ComponentLink1Description: Datasheet; ComponentLink1URL: https://wmsc.lcsc.com/wmsc/upload/file/pdf/v2/lcsc/2304140030_Murata-Electronics-GRM1885C1H100FA01D_C162202.pdf; ComponentLink2Description: JLCPCB Part URL; ComponentLink2URL: https://jlcpcb.com/partdetail/C162202; ComponentLink3Description: LCSC Part URL; ComponentLink3URL: https://lcsc.com/product-detail/Multilayer-Ceramic-Capacitors-MLCC---SMD-SMT_Murata-Electronics-Murata-Electronics-GRM1885C1H100FA01D_C162202.html
footprint CAP-0603 (0603 (1608M) Capacitor)
pins: 1, 2

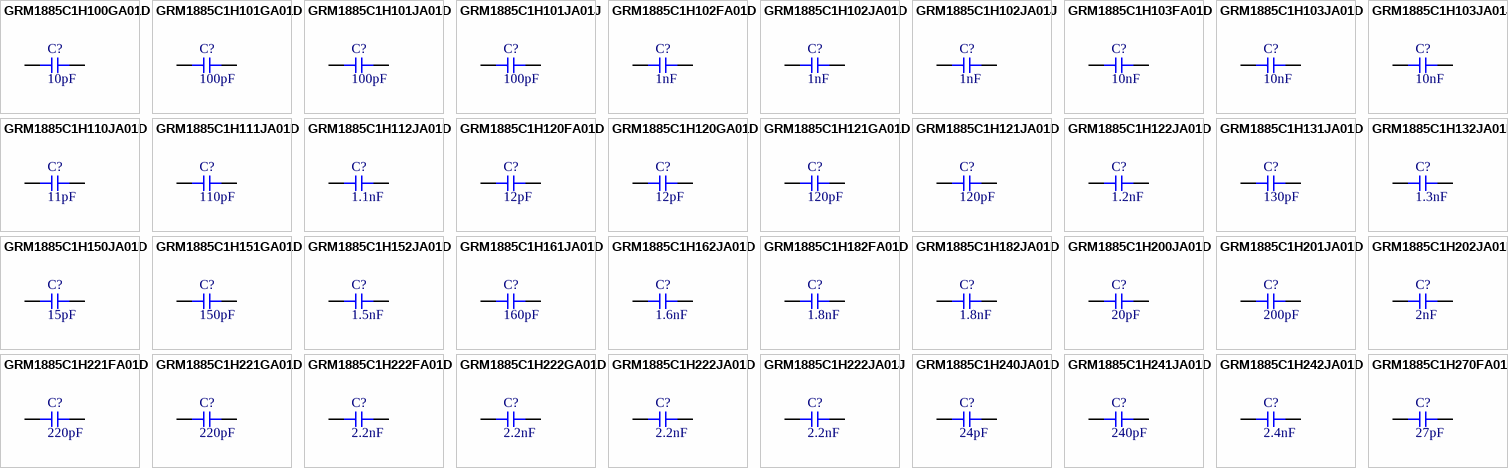
[diagram p77: symbols GRM1885C1H100GA01D to GRM1885C1H270FA01D]

## GRM1885C1H100GA01D
designator C?  Capacitance: 10pF  (hidden comment: *)
Capacitor, Ceramic (MLCC), 10pF, 50V, C0G, SMD 0603; Manufacturer: Murata Electronics; Manufacturer Part Number: GRM1885C1H100GA01D; Package Size: 0603; JLCPCB Basic Part: No; JLCPCB Part Number: C2987939; Supplier 1: LCSC; Category: Capacitors - MLCC; Supplier Part Number 1: C2987939; Voltage Rating: 50V; Temperature Coefficient: C0G; RoHS: Yes; ComponentLink1Description: Datasheet; ComponentLink1URL: https://wmsc.lcsc.com/wmsc/upload/file/pdf/v2/lcsc/2207041730_Murata-Electronics-GRM1885C1H100GA01D_C2987939.pdf; ComponentLink2Description: JLCPCB Part URL; ComponentLink2URL: https://jlcpcb.com/partdetail/C2987939; ComponentLink3Description: LCSC Part URL; ComponentLink3URL: https://lcsc.com/product-detail/Multilayer-Ceramic-Capacitors-MLCC---SMD-SMT_Murata-Electronics-Murata-Electronics-GRM1885C1H100GA01D_C2987939.html
footprint CAP-0603 (0603 (1608M) Capacitor)
pins: 1, 2

## GRM1885C1H101GA01D
designator C?  Capacitance: 100pF  (hidden comment: *)
Capacitor, Ceramic (MLCC), 100pF, ±2%, null, null, ±2%, SMD 0603; Manufacturer: Murata Electronics; Manufacturer Part Number: GRM1885C1H101GA01D; Package Size: 0603; JLCPCB Basic Part: No; JLCPCB Part Number: C882529; Supplier 1: LCSC; Category: Capacitors - MLCC; Supplier Part Number 1: C882529; Tolerance: ±2%; Voltage Rating: null; Temperature Coefficient: null; RoHS: Yes; ComponentLink1Description: Datasheet; ComponentLink1URL: https://wmsc.lcsc.com/wmsc/upload/file/pdf/v2/lcsc/2201242130_Murata-Electronics-GRM1885C1H101GA01D_C882529.pdf; ComponentLink2Description: JLCPCB Part URL; ComponentLink2URL: https://jlcpcb.com/partdetail/C882529; ComponentLink3Description: LCSC Part URL; ComponentLink3URL: https://lcsc.com/product-detail/Multilayer-Ceramic-Capacitors-MLCC---SMD-SMT_Murata-Electronics-Murata-Electronics-GRM1885C1H101GA01D_C882529.html
footprint CAP-0603 (0603 (1608M) Capacitor)
pins: 1, 2

## GRM1885C1H101JA01D
designator C?  Capacitance: 100pF  (hidden comment: *)
Capacitor, Ceramic (MLCC), 100pF, ±5%, 50V, C0G, ±5%, SMD 0603; Manufacturer: Murata Electronics; Manufacturer Part Number: GRM1885C1H101JA01D; Package Size: 0603; JLCPCB Basic Part: No; JLCPCB Part Number: C71664; Supplier 1: LCSC; Category: Capacitors - MLCC; Supplier Part Number 1: C71664; Tolerance: ±5%; Voltage Rating: 50V; Temperature Coefficient: C0G; RoHS: Yes; ComponentLink1Description: Datasheet; ComponentLink1URL: https://wmsc.lcsc.com/wmsc/upload/file/pdf/v2/lcsc/1811141412_Murata-Electronics-GRM1885C1H101JA01D_C71664.pdf; ComponentLink2Description: JLCPCB Part URL; ComponentLink2URL: https://jlcpcb.com/partdetail/C71664; ComponentLink3Description: LCSC Part URL; ComponentLink3URL: https://lcsc.com/product-detail/Multilayer-Ceramic-Capacitors-MLCC---SMD-SMT_Murata-Electronics-Murata-Electronics-GRM1885C1H101JA01D_C71664.html
footprint CAP-0603 (0603 (1608M) Capacitor)
pins: 1, 2

## GRM1885C1H101JA01J
designator C?  Capacitance: 100pF  (hidden comment: *)
Capacitor, Ceramic (MLCC), 100pF, ±5%, 50V, C0G, ±5%, SMD 0603; Manufacturer: Murata Electronics; Manufacturer Part Number: GRM1885C1H101JA01J; Package Size: 0603; JLCPCB Basic Part: No; JLCPCB Part Number: C415381; Supplier 1: LCSC; Category: Capacitors - MLCC; Supplier Part Number 1: C415381; Tolerance: ±5%; Voltage Rating: 50V; Temperature Coefficient: C0G; RoHS: Yes; ComponentLink1Description: Datasheet; ComponentLink1URL: https://wmsc.lcsc.com/wmsc/upload/file/pdf/v2/lcsc/2304140030_Murata-Electronics-GRM1885C1H101JA01J_C415381.pdf; ComponentLink2Description: JLCPCB Part URL; ComponentLink2URL: https://jlcpcb.com/partdetail/C415381; ComponentLink3Description: LCSC Part URL; ComponentLink3URL: https://lcsc.com/product-detail/Multilayer-Ceramic-Capacitors-MLCC---SMD-SMT_Murata-Electronics-Murata-Electronics-GRM1885C1H101JA01J_C415381.html
footprint CAP-0603 (0603 (1608M) Capacitor)
pins: 1, 2

## GRM1885C1H102FA01D
designator C?  Capacitance: 1nF  (hidden comment: *)
Capacitor, Ceramic (MLCC), 1nF, ±1%, ±1%, SMD 0603; Manufacturer: Murata Electronics; Manufacturer Part Number: GRM1885C1H102FA01D; Package Size: 0603; JLCPCB Basic Part: No; JLCPCB Part Number: C913702; Supplier 1: LCSC; Category: Capacitors - MLCC; Supplier Part Number 1: C913702; Tolerance: ±1%; RoHS: Yes; ComponentLink1Description: Datasheet; ComponentLink2Description: JLCPCB Part URL; ComponentLink2URL: https://jlcpcb.com/partdetail/C913702; ComponentLink3Description: LCSC Part URL; ComponentLink3URL: https://lcsc.com/product-detail/Multilayer-Ceramic-Capacitors-MLCC---SMD-SMT_Murata-Electronics-Murata-Electronics-GRM1885C1H102FA01D_C913702.html
footprint CAP-0603 (0603 (1608M) Capacitor)
pins: 1, 2

## GRM1885C1H102JA01D
designator C?  Capacitance: 1nF  (hidden comment: *)
Capacitor, Ceramic (MLCC), 1nF, ±5%, 50V, C0G, ±5%, SMD 0603; Manufacturer: Murata Electronics; Manufacturer Part Number: GRM1885C1H102JA01D; Package Size: 0603; JLCPCB Basic Part: No; JLCPCB Part Number: C77026; Supplier 1: LCSC; Category: Capacitors - MLCC; Supplier Part Number 1: C77026; Tolerance: ±5%; Voltage Rating: 50V; Temperature Coefficient: C0G; RoHS: Yes; ComponentLink1Description: Datasheet; ComponentLink1URL: https://wmsc.lcsc.com/wmsc/upload/file/pdf/v2/lcsc/2304140030_Murata-Electronics-GRM1885C1H102JA01D_C77026.pdf; ComponentLink2Description: JLCPCB Part URL; ComponentLink2URL: https://jlcpcb.com/partdetail/C77026; ComponentLink3Description: LCSC Part URL; ComponentLink3URL: https://lcsc.com/product-detail/Multilayer-Ceramic-Capacitors-MLCC---SMD-SMT_Murata-Electronics-Murata-Electronics-GRM1885C1H102JA01D_C77026.html
footprint CAP-0603 (0603 (1608M) Capacitor)
pins: 1, 2

## GRM1885C1H102JA01J
designator C?  Capacitance: 1nF  (hidden comment: *)
Capacitor, Ceramic (MLCC), 1nF, ±5%, 50V, null, ±5%, SMD 0603; Manufacturer: Murata Electronics; Manufacturer Part Number: GRM1885C1H102JA01J; Package Size: 0603; JLCPCB Basic Part: No; JLCPCB Part Number: C2167114; Supplier 1: LCSC; Category: Capacitors - MLCC; Supplier Part Number 1: C2167114; Tolerance: ±5%; Voltage Rating: 50V; Temperature Coefficient: null; RoHS: Yes; ComponentLink1Description: Datasheet; ComponentLink1URL: https://wmsc.lcsc.com/wmsc/upload/file/pdf/v2/lcsc/2202040230_Murata-Electronics-GRM1885C1H102JA01J_C2167114.pdf; ComponentLink2Description: JLCPCB Part URL; ComponentLink2URL: https://jlcpcb.com/partdetail/C2167114; ComponentLink3Description: LCSC Part URL; ComponentLink3URL: https://lcsc.com/product-detail/Multilayer-Ceramic-Capacitors-MLCC---SMD-SMT_Murata-Electronics-Murata-Electronics-GRM1885C1H102JA01J_C2167114.html
footprint CAP-0603 (0603 (1608M) Capacitor)
pins: 1, 2

## GRM1885C1H103FA01D
designator C?  Capacitance: 10nF  (hidden comment: *)
Capacitor, Ceramic (MLCC), 10nF, ±1%, ±1%, SMD 0603; Manufacturer: Murata Electronics; Manufacturer Part Number: GRM1885C1H103FA01D; Package Size: 0603; JLCPCB Basic Part: No; JLCPCB Part Number: C5299898; Supplier 1: LCSC; Category: Capacitors - MLCC; Supplier Part Number 1: C5299898; Tolerance: ±1%; RoHS: Yes; ComponentLink1Description: Datasheet; ComponentLink1URL: https://wmsc.lcsc.com/wmsc/upload/file/pdf/v2/lcsc/2212071009_Murata-Electronics-GRM1885C1H103FA01D_C5299898.pdf; ComponentLink2Description: JLCPCB Part URL; ComponentLink2URL: https://jlcpcb.com/partdetail/C5299898; ComponentLink3Description: LCSC Part URL; ComponentLink3URL: https://lcsc.com/product-detail/Multilayer-Ceramic-Capacitors-MLCC---SMD-SMT_Murata-Electronics-Murata-Electronics-GRM1885C1H103FA01D_C5299898.html
footprint CAP-0603 (0603 (1608M) Capacitor)
pins: 1, 2

## GRM1885C1H103JA01D
designator C?  Capacitance: 10nF  (hidden comment: *)
Capacitor, Ceramic (MLCC), 10nF, ±5%, 50V, C0G, ±5%, SMD 0603; Manufacturer: Murata Electronics; Manufacturer Part Number: GRM1885C1H103JA01D; Package Size: 0603; JLCPCB Basic Part: No; JLCPCB Part Number: C85973; Supplier 1: LCSC; Category: Capacitors - MLCC; Supplier Part Number 1: C85973; Tolerance: ±5%; Voltage Rating: 50V; Temperature Coefficient: C0G; RoHS: Yes; ComponentLink1Description: Datasheet; ComponentLink1URL: https://wmsc.lcsc.com/wmsc/upload/file/pdf/v2/lcsc/2304140030_Murata-Electronics-GRM1885C1H103JA01D_C85973.pdf; ComponentLink2Description: JLCPCB Part URL; ComponentLink2URL: https://jlcpcb.com/partdetail/C85973; ComponentLink3Description: LCSC Part URL; ComponentLink3URL: https://lcsc.com/product-detail/Multilayer-Ceramic-Capacitors-MLCC---SMD-SMT_Murata-Electronics-Murata-Electronics-GRM1885C1H103JA01D_C85973.html
footprint CAP-0603 (0603 (1608M) Capacitor)
pins: 1, 2

## GRM1885C1H103JA01J
designator C?  Capacitance: 10nF  (hidden comment: *)
Capacitor, Ceramic (MLCC), 10nF, ±5%, 50V, null, ±5%, SMD 0603; Manufacturer: Murata Electronics; Manufacturer Part Number: GRM1885C1H103JA01J; Package Size: 0603; JLCPCB Basic Part: No; JLCPCB Part Number: C2215227; Supplier 1: LCSC; Category: Capacitors - MLCC; Supplier Part Number 1: C2215227; Tolerance: ±5%; Voltage Rating: 50V; Temperature Coefficient: null; RoHS: Yes; ComponentLink1Description: Datasheet; ComponentLink1URL: https://wmsc.lcsc.com/wmsc/upload/file/pdf/v2/lcsc/2104160540_Murata-Electronics-GRM1885C1H103JA01J_C2215227.pdf; ComponentLink2Description: JLCPCB Part URL; ComponentLink2URL: https://jlcpcb.com/partdetail/C2215227; ComponentLink3Description: LCSC Part URL; ComponentLink3URL: https://lcsc.com/product-detail/Multilayer-Ceramic-Capacitors-MLCC---SMD-SMT_Murata-Electronics-Murata-Electronics-GRM1885C1H103JA01J_C2215227.html
footprint CAP-0603 (0603 (1608M) Capacitor)
pins: 1, 2

## GRM1885C1H110JA01D
designator C?  Capacitance: 11pF  (hidden comment: *)
Capacitor, Ceramic (MLCC), 11pF, ±5%, 50V, null, ±5%, SMD 0603; Manufacturer: Murata Electronics; Manufacturer Part Number: GRM1885C1H110JA01D; Package Size: 0603; JLCPCB Basic Part: No; JLCPCB Part Number: C162203; Supplier 1: LCSC; Category: Capacitors - MLCC; Supplier Part Number 1: C162203; Tolerance: ±5%; Voltage Rating: 50V; Temperature Coefficient: null; RoHS: Yes; ComponentLink1Description: Datasheet; ComponentLink1URL: https://wmsc.lcsc.com/wmsc/upload/file/pdf/v2/lcsc/2105241135_Murata-Electronics-GRM1885C1H110JA01D_C162203.pdf; ComponentLink2Description: JLCPCB Part URL; ComponentLink2URL: https://jlcpcb.com/partdetail/C162203; ComponentLink3Description: LCSC Part URL; ComponentLink3URL: https://lcsc.com/product-detail/Multilayer-Ceramic-Capacitors-MLCC---SMD-SMT_Murata-Electronics-Murata-Electronics-GRM1885C1H110JA01D_C162203.html
footprint CAP-0603 (0603 (1608M) Capacitor)
pins: 1, 2

## GRM1885C1H111JA01D
designator C?  Capacitance: 110pF  (hidden comment: *)
Capacitor, Ceramic (MLCC), 110pF, ±5%, null, null, ±5%, SMD 0603; Manufacturer: Murata Electronics; Manufacturer Part Number: GRM1885C1H111JA01D; Package Size: 0603; JLCPCB Basic Part: No; JLCPCB Part Number: C882528; Supplier 1: LCSC; Category: Capacitors - MLCC; Supplier Part Number 1: C882528; Tolerance: ±5%; Voltage Rating: null; Temperature Coefficient: null; RoHS: Yes; ComponentLink1Description: Datasheet; ComponentLink1URL: https://wmsc.lcsc.com/wmsc/upload/file/pdf/v2/lcsc/2201242130_Murata-Electronics-GRM1885C1H111JA01D_C882528.pdf; ComponentLink2Description: JLCPCB Part URL; ComponentLink2URL: https://jlcpcb.com/partdetail/C882528; ComponentLink3Description: LCSC Part URL; ComponentLink3URL: https://lcsc.com/product-detail/Multilayer-Ceramic-Capacitors-MLCC---SMD-SMT_Murata-Electronics-Murata-Electronics-GRM1885C1H111JA01D_C882528.html
footprint CAP-0603 (0603 (1608M) Capacitor)
pins: 1, 2
